# Altium footprint library SEMICONDUCTORS.PcbLib: 91 footprints (part 6 of 6)
Each footprint in its own frame and in the unit in brackets; x right, y up, seen from the top. Pads: shape width x height; smd on the part's side, far side on the other; paste and mask are expansions set on the pad; w line width, h text height; cw(c..) or ccw(c..) is an arc to the next point about the centre after c.
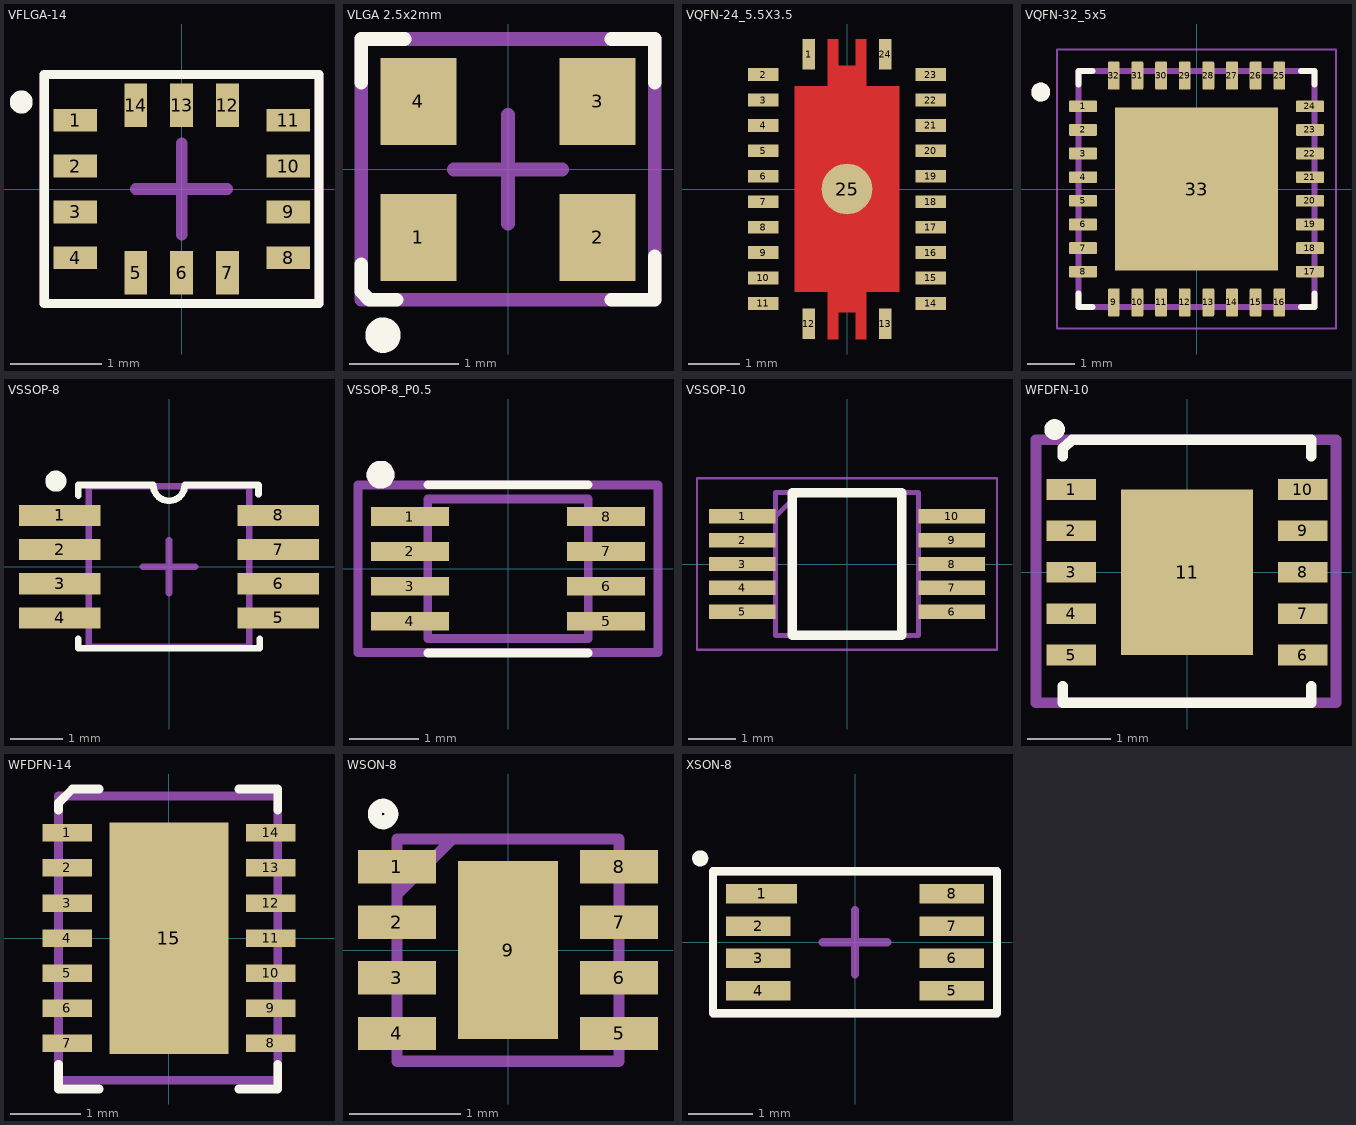
[diagram p5: the footprints below, top view; thin cyan lines are the x and y axes]

## VFLGA-14 [mm]
pads (14):
  rect 0.475x0.25 smd paste+0 mask+0.025: 1(-1.162,0.75) 2(-1.162,0.25) 3(-1.162,-0.25) 4(-1.162,-0.75) 8(1.162,-0.75) 9(1.162,-0.25) 10(1.162,0.25) 11(1.162,0.75)
  rect 0.25x0.475 smd paste+0 mask+0.025: 5(-0.5,-0.912) 6(0,-0.912) 7(0.5,-0.912) 12(0.5,0.912) 13(0,0.912) 14(-0.5,0.912)
Top Overlay:
  circle w0.2: c-1.75,0.95 r0.025
  lines w0.1: -1.5,-1.25 1.5,-1.25 1.5,1.25 -1.5,1.25 -1.5,-1.25
Top Assembly:
  lines w0.102: -1.5,-1.25 -1.5,1.25 1.5,1.25 1.5,-1.25 -1.5,-1.25
  text ".Designator" at -1.2,-0.375 h1
Top Component Center:
  lines w0.127: -0.5,0 0.5,0 ; 0,-0.5 0,0.5
3D body: height 0.86, standoff 0.04, extent -1.5,-1.25 1.5,1.25
3D body: height 0.91, standoff 0.04, extent -1.349,0.9 -1.15,1.1

## VLGA 2.5x2mm [mm]
pads (4):
  rect 0.7x0.8 smd: 1(-0.825,-0.625) 2(0.825,-0.625) 3(0.825,0.625) 4(-0.825,0.625)
Top Overlay:
  circle w0.254: c-1.15,-1.525 r0.035
  lines w0.127: -1.35,-1.05 -1.35,-1 ; -1.35,-0.875 -1.35,-1.125 -1.275,-1.2 -1.025,-1.2 ; -1.35,0.8 -1.35,1.2 -0.95,1.2 ; 0.95,-1.2 1.35,-1.2 1.35,-0.8 ; 0.95,1.2 1.35,1.2 1.35,0.8
Top Assembly:
  lines w0.127: -1.35,-1.2 -1.35,1.2 1.35,1.2 1.35,-1.2 -1.35,-1.2
  text ".Designator" at -0.975,-0.375 h0.8
Top Component Center:
  lines w0.127: -0.5,0 0.5,0 ; 0,-0.5 0,0.5
3D body: height 0.84, standoff 0, extent -1.254,-1.003 1.254,1.003

## VQFN-24_5.5X3.5 [mm]
pads (25):
  rect 0.25x0.6 smd mask+0.05: 1(-0.75,2.65) 12(-0.75,-2.65) 13(0.75,-2.65) 24(0.75,2.65)
  rect 0.6x0.25 smd mask+0.05: 2(-1.65,2.25) 3(-1.65,1.75) 4(-1.65,1.25) 5(-1.65,0.75) 6(-1.65,0.25) 7(-1.65,-0.25) 8(-1.65,-0.75) 9(-1.65,-1.25) 10(-1.65,-1.75) 11(-1.65,-2.25) 14(1.65,-2.25) 15(1.65,-1.75) 16(1.65,-1.25) 17(1.65,-0.75) 18(1.65,-0.25) 19(1.65,0.25) 20(1.65,0.75) 21(1.65,1.25) 22(1.65,1.75) 23(1.65,2.25)
  round 1 smd mask+0.05: 25(0,0)
Top Layer:
  region: -1.016,1.988
  region: -0.375,2.95 -0.175,2.95 -0.175,2.428 0.167,2.428 0.175,2.436 0.175,2.95 0.375,2.95 0.375,2.025 1.025,2.025 1.025,-2.025 0.375,-2.025 0.375,-2.95 0.175,-2.95 0.175,-2.428 -0.175,-2.428 -0.175,-2.95 -0.375,-2.95 -0.375,-2.025 -1.025,-2.025 -1.025,2.025 -0.375,2.025
Top Paste:
  rectangle: -0.9,0.7 -0.1,1.9
  rectangle: 0.1,0.7 0.9,1.9
  rectangle: 0.1,-0.5 0.9,0.5
  rectangle: -0.9,-0.5 -0.1,0.5
  rectangle: 0.1,-1.9 0.9,-0.7
  rectangle: -0.9,-1.9 -0.1,-0.7
  region: 0.375,-2.057 -0.375,-2.057 -0.375,-2.435 0.375,-2.435
  region: -0.175,-2.057 -0.375,-2.057 -0.375,-2.946 -0.175,-2.946
  region: 0.375,-2.057 0.175,-2.057 0.175,-2.946 0.375,-2.946
  rectangle: -0.375,2.061 -0.175,2.95
  rectangle: 0.175,2.061 0.375,2.95
  rectangle: -0.375,2.061 0.375,2.438
3D body "VQFN-24_5.5X3.5.STEP": height 1, standoff 0, extent -1.76,-2.76 1.76,2.76

## VQFN-32_5x5 [mm] "32-VFQFN Exposed Pad"
height 0.9
pads (33):
  rrect25% 0.6x0.25 smd mask+0: 1(-2.4,1.75) 2(-2.4,1.25) 3(-2.4,0.75) 4(-2.4,0.25) 5(-2.4,-0.25) 6(-2.4,-0.75) 7(-2.4,-1.25) 8(-2.4,-1.75) 17(2.4,-1.75) 18(2.4,-1.25) 19(2.4,-0.75) 20(2.4,-0.25) 21(2.4,0.25) 22(2.4,0.75) 23(2.4,1.25) 24(2.4,1.75)
  rrect25% 0.25x0.6 smd mask+0: 9(-1.75,-2.4) 10(-1.25,-2.4) 11(-0.75,-2.4) 12(-0.25,-2.4) 13(0.25,-2.4) 14(0.75,-2.4) 15(1.25,-2.4) 16(1.75,-2.4) 25(1.75,2.4) 26(1.25,2.4) 27(0.75,2.4) 28(0.25,2.4) 29(-0.25,2.4) 30(-0.75,2.4) 31(-1.25,2.4) 32(-1.75,2.4)
  rect 3.45x3.45 smd paste-3 mask+0: 33(0,0)
Top Overlay:
  circle w0.2: c-3.295,2.05 r0.1
  lines w0.127: -2.5,-2.205 -2.5,-2.5 -2.205,-2.5 ; -2.5,2.205 -2.5,2.5 -2.205,2.5 ; 2.205,-2.5 2.5,-2.5 2.5,-2.205 ; 2.205,2.5 2.5,2.5 2.5,2.205
Top Paste:
  region: -0.1,0.1 -1.59,0.1 -1.59,1.59 -0.1,1.59
  region: 1.59,0.1 0.1,0.1 0.1,1.59 1.59,1.59
  region: -0.1,-1.59 -1.59,-1.59 -1.59,-0.1 -0.1,-0.1
  region: 1.59,-1.59 0.1,-1.59 0.1,-0.1 1.59,-0.1
Top Solder:
  drawing of 33 lines, arcs and shapes, not listed
Mechanical 13:
  circle w0.2: c-3.295,2.05 r0.1
  lines w0.127: -2.5,-2.5 2.5,-2.5 2.5,2.5 -2.5,2.5 -2.5,-2.5
Mechanical 15:
  lines w0.05: -2.95,-2.95 2.95,-2.95 2.95,2.95 -2.95,2.95 -2.95,-2.95
3D body "VQFN-32_5x5.step": height 0.99, standoff 0, extent -2.553,-2.553 2.553,2.553

## VSSOP-8 [mm]
pads (8):
  rect 1.55x0.4 smd paste-0.051 mask+0.08: 1(-2.075,0.975) 2(-2.075,0.325) 3(-2.075,-0.325) 4(-2.075,-0.975) 5(2.075,-0.975) 6(2.075,-0.325) 7(2.075,0.325) 8(2.075,0.975)
Top Overlay:
  circle w0.2: c-2.15,1.625 r0.1
  lines w0.127: -1.725,-1.375 -1.725,-1.55 1.725,-1.55 1.725,-1.375 ; -1.725,1.35 -1.725,1.55 -0.3,1.55 ccw(c0,1.55) 0.3,1.55 1.7,1.55 1.7,1.375
Top Assembly:
  lines w0.127: -1.525,-1.525 -1.525,1.525 -1.5,1.525 1.525,1.525 1.525,-1.525 -1.525,-1.525
  text ".Designator" at -1.225,-0.475 h1
Top Component Center:
  lines w0.127: -0.5,0 0.5,0 ; 0,-0.5 0,0.5
3D body "VSSOP-8.STEP": height 1.1, standoff 0, extent -2.45,-1.5 2.45,1.5

## VSSOP-8_P0.5 [mm]
pads (8):
  rrect0% 1.12x0.27 smd: 1(-1.405,0.75) 2(-1.405,0.25) 3(-1.405,-0.25) 4(-1.405,-0.75) 5(1.405,-0.75) 6(1.405,-0.25) 7(1.405,0.25) 8(1.405,0.75)
Top Overlay:
  circle w0.2: c-1.825,1.35 r0.1
  lines w0.127: -1.15,-1.205 1.15,-1.205 ; -1.15,1.205 1.15,1.205
Top Assembly:
  lines w0.127: -2.15,-1.2 2.15,-1.2 2.15,1.2 -2.15,1.2 -2.15,-1.2
  text ".Designator" at -1.225,-0.475 h1
Mechanical 13:
  circle w0.2: c-1.825,1.35 r0.1
  lines w0.127: -1.15,-1 1.15,-1 1.15,1 -1.15,1 -1.15,-1
3D body "SN74LVC2G08DCUR.step": height 0.9, standoff 0, extent -1.55,-1 1.55,1

## VSSOP-10 [mm]
pads (10):
  rect 1.4x0.3 smd: 1(-2.2,1) 2(-2.2,0.5) 3(-2.2,0) 4(-2.2,-0.5) 5(-2.2,-1) 6(2.2,-1) 7(2.2,-0.5) 8(2.2,0) 9(2.2,0.5) 10(2.2,1)
Top Overlay:
  lines w0.2: -1.15,-1.5 1.15,-1.5 1.15,1.5 -1.15,1.5 -1.15,-1.5
Mechanical 15:
  lines w0.1: -1.5,1 -1,1.5 ; -1.5,-1.5 1.5,-1.5 1.5,1.5 -1.5,1.5 -1.5,-1.5
Mechanical 20:
  lines w0.05: -3.15,-1.8 3.15,-1.8 3.15,1.8 -3.15,1.8 -3.15,-1.8
3D body "VSSOP-10.stp": height 1.09, standoff -0.01, extent -2.463,-1.5 2.463,1.5

## WFDFN-10 [mm]
height 0.8
pads (11):
  rect 0.6x0.25 smd: 1(-1.4,1) 2(-1.4,0.5) 3(-1.4,0) 4(-1.4,-0.5) 5(-1.4,-1) 6(1.4,-1) 7(1.4,-0.5) 8(1.4,0) 9(1.4,0.5) 10(1.4,1)
  rect 1.6x2 smd paste-0.3: 11(0,0)
Top Overlay:
  circle w0.15: c-1.6,1.725 r0.05
  lines w0.127: -1.5,-1.375 -1.5,-1.575 1.5,-1.575 1.5,-1.375 ; -1.5,1.4 -1.5,1.5 -1.387,1.6 -1.275,1.6 1.5,1.6 1.5,1.4
Top Assembly:
  lines w0.127: -1.825,-1.575 -1.825,1.6 1.8,1.6 1.8,-1.575 -1.825,-1.575
  text ".Designator" at -1.225,-0.325 h1
Top Component Center:
  lines w0.127: -0.5,0 0.5,0 ; 0,-0.5 0,0.5
3D body "WDFN-10.STEP": height 0.8, standoff 0, extent -1.545,-1.55 1.575,1.55

## WFDFN-14 [mm]
pads (15):
  rect 0.7x0.25 smd: 1(-1.45,1.5) 2(-1.45,1) 3(-1.45,0.5) 4(-1.45,0) 5(-1.45,-0.5) 6(-1.45,-1) 7(-1.45,-1.5) 8(1.45,-1.5) 9(1.45,-1) 10(1.45,-0.5) 11(1.45,0) 12(1.45,0.5) 13(1.45,1) 14(1.45,1.5)
  rect 1.7x3.3 smd: 15(0,0)
Top Overlay:
  lines w0.127: -1.575,-1.8 -1.575,-2.15 -1,-2.15 ; -1.575,1.825 -1.575,1.925 -1.375,2.125 -1,2.125 ; 1,-2.15 1.55,-2.15 1.55,-1.8 ; 1,2.125 1.55,2.125 1.55,1.825
Top Assembly:
  lines w0.127: -1.575,-2.025 -1.575,2.025 1.55,2.025 1.55,-2.025 -1.575,-2.025
  text ".Designator" at 0.375,-1.425 h1.2
Top Component Center:
  lines w0.127: -0.5,0 0.5,0 ; 0,-0.5 0,0.5
3D body "WDFN-14.STEP": height 0.75, standoff 0, extent -1.498,-2 1.501,2

## WSON-8 [mm]
pads (9):
  rect 0.7x0.3 smd: 1(-1,0.75) 2(-1,0.25) 3(-1,-0.25) 4(-1,-0.75) 5(1,-0.75) 6(1,-0.25) 7(1,0.25) 8(1,0.75)
  rect 0.9x1.6 smd: 9(0,0)
Top Overlay:
  circle w0.125: c-1.125,1.225 r0.075
Mechanical 13:
  lines w0.1: -1,0.5 -0.5,1 ; -1,-1 -1,1 1,1 1,-1 -1,-1
3D body "BQ25173DSGR.stp": height 0.77, standoff 0, extent -1,-1 1,1

## XSON-8 [mm]
pads (8):
  rect 1.1x0.3 smd: 1(-1.45,0.75)
  rect 1x0.3 smd: 2(-1.5,0.25) 3(-1.5,-0.25) 4(-1.5,-0.75) 5(1.5,-0.75) 6(1.5,-0.25) 7(1.5,0.25) 8(1.5,0.75)
Top Overlay:
  circle w0.15: c-2.4,1.3 r0.05
  lines w0.127: -2.2,-1.1 -2.2,1.1 2.2,1.1 2.2,-1.1 -2.2,-1.1
Top Assembly:
  lines w0.127: -2.2,-1.1 2.2,-1.1 2.2,1.1 -2.2,1.1 -2.2,-1.1
  text ".Designator" at -1.413,-0.25 h0.7
Top Component Center:
  lines w0.127: -0.5,0 0.5,0 ; 0,-0.5 0,0.5
3D body: height 0.51, standoff 0.15, extent -1.199,0.5 -1,0.7
3D body: height 0.1, standoff 0, extent 0.837,0.575 1.413,0.925
3D body: height 0.1, standoff 0, extent 0.837,0.075 1.413,0.425
3D body: height 0.1, standoff 0, extent 0.837,-0.425 1.413,-0.075
3D body: height 0.1, standoff 0, extent 0.837,-0.925 1.413,-0.575
3D body: height 0.1, standoff 0, extent -1.413,-0.925 -0.837,-0.575
3D body: height 0.1, standoff 0, extent -1.413,-0.425 -0.837,-0.075
3D body: height 0.1, standoff 0, extent -1.413,0.075 -0.837,0.425
3D body: height 0.1, standoff 0, extent -1.413,0.575 -0.837,0.925
3D body: height 0.5, standoff 0.05, extent -1.55,-1.05 1.55,1.05